# Altium footprint library GyokuRe.PcbLib: 1248 footprints (part 66 of 78)
Each footprint in its own frame and in the unit in brackets; x right, y up, seen from the top. Pads: shape width x height; smd on the part's side, far side on the other; paste and mask are expansions set on the pad; w line width, h text height; cw(c..) or ccw(c..) is an arc to the next point about the centre after c.
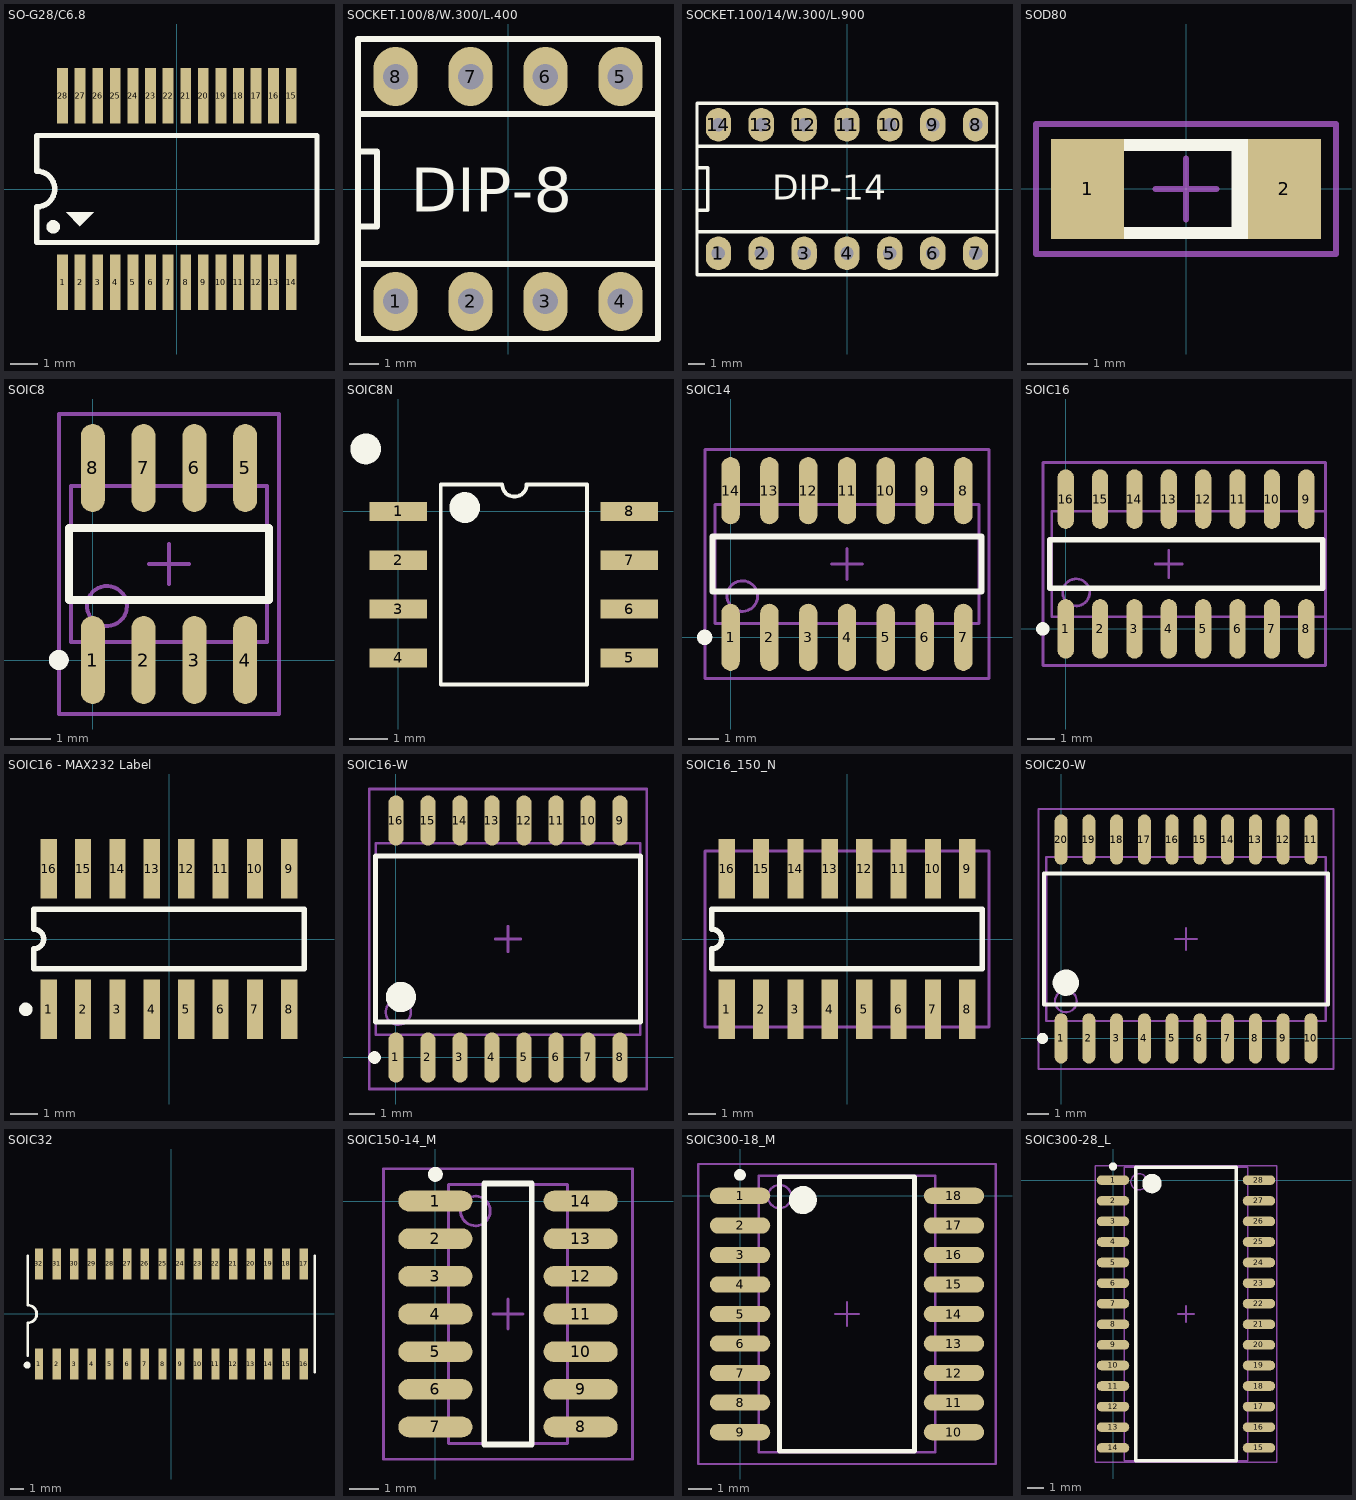
[diagram p65: the footprints below, top view; thin cyan lines are the x and y axes]

## SO-G28/C6.8 [mm] "SSOP, Plastic; 28 Leads; Body Width 5.3 mm; Pitch 0.65 mm"
height 1.99
pads (28):
  rect 0.4x2.05 smd: 1(-4.225,-3.451) 2(-3.575,-3.451) 3(-2.925,-3.451) 4(-2.275,-3.451) 5(-1.625,-3.451) 6(-0.975,-3.451) 7(-0.325,-3.451) 8(0.325,-3.451) 9(0.975,-3.451) 10(1.625,-3.451) 11(2.275,-3.451) 12(2.925,-3.451) 13(3.575,-3.451) 14(4.225,-3.451) 15(4.225,3.451) 16(3.575,3.451) 17(2.925,3.451) 18(2.275,3.451) 19(1.625,3.451) 20(0.975,3.451) 21(0.325,3.451) 22(-0.325,3.451) 23(-0.975,3.451) 24(-1.625,3.451) 25(-2.275,3.451) 26(-2.925,3.451) 27(-3.575,3.451) 28(-4.225,3.451)
Top Overlay:
  circle w0.25: c-4.57,-1.397 r0.125
  region: -4.089,-0.864 -3.581,-1.372 -3.073,-0.864
  lines w0.2: -5.175,-1.975 -5.175,-0.658 ccw(c-5.175,0) -5.175,0.658 -5.175,1.975 5.175,1.975 5.175,-1.975 -5.175,-1.975
3D body: height 0.25, standoff 0, extent -3.759,-3.429 -3.378,-2.032
3D body: height 0.25, standoff 0, extent -4.42,-3.429 -4.039,-2.032
3D body: height 1.02, standoff 0.23, extent -5.156,-1.981 5.258,2.083
3D body: height 0.25, standoff 0, extent -3.124,-3.454 -2.743,-2.057
3D body: height 0.25, standoff 0, extent -2.464,-3.454 -2.083,-2.057
3D body: height 0.25, standoff 0, extent -1.829,-3.454 -1.448,-2.057
3D body: height 0.25, standoff 0, extent -1.168,-3.454 -0.787,-2.057
3D body: height 0.25, standoff 0, extent -0.508,-3.454 -0.127,-2.057
3D body: height 0.25, standoff 0, extent 0.152,-3.454 0.533,-2.057
3D body: height 0.25, standoff 0, extent 0.762,-3.454 1.143,-2.057
3D body: height 0.25, standoff 0, extent 1.422,-3.454 1.803,-2.057
3D body: height 0.25, standoff 0, extent 2.083,-3.454 2.464,-2.057
3D body: height 0.25, standoff 0, extent 2.743,-3.454 3.124,-2.057
3D body: height 0.25, standoff 0, extent 3.378,-3.454 3.759,-2.057
3D body: height 0.25, standoff 0, extent 4.039,-3.454 4.42,-2.057
3D body: height 0.25, standoff 0, extent 4.039,2.007 4.42,3.404
3D body: height 0.25, standoff 0, extent 3.378,2.007 3.759,3.404
3D body: height 0.25, standoff 0, extent 2.743,2.007 3.124,3.404
3D body: height 0.25, standoff 0, extent 2.083,2.007 2.464,3.404
3D body: height 0.25, standoff 0, extent 1.422,2.007 1.803,3.404
3D body: height 0.25, standoff 0, extent 0.762,2.007 1.143,3.404
3D body: height 0.25, standoff 0, extent 0.152,2.007 0.533,3.404
3D body: height 0.25, standoff 0, extent -0.508,2.007 -0.127,3.404
3D body: height 0.25, standoff 0, extent -1.168,2.007 -0.787,3.404
3D body: height 0.25, standoff 0, extent -1.829,2.007 -1.448,3.404
3D body: height 0.25, standoff 0, extent -2.464,2.007 -2.083,3.404
3D body: height 0.25, standoff 0, extent -3.124,2.007 -2.743,3.404
3D body: height 0.25, standoff 0, extent -4.42,2.032 -4.039,3.429
3D body: height 0.25, standoff 0, extent -3.759,2.032 -3.378,3.429
3D body: height 1.27, standoff 1.02, extent -2.032,-0.305 -1.245,1.092
3D body: height 1.27, standoff 1.02, extent -3.175,-0.305 -2.362,1.092
3D body: height 1.27, standoff 1.02, extent -0.914,-0.305 -0.102,1.092
3D body: height 1.27, standoff 1.02, extent 0.254,-0.305 1.168,1.092
3D body: height 1.27, standoff 1.02, extent 1.524,-0.305 2.54,1.092
3D body: height 1.27, standoff 1.02, extent 2.794,-0.33 3.708,1.067
3D body: height 1.14, standoff 1.02, extent -4.804,-1.748 -4.296,-1.24

## SOCKET.100/8/W.300/L.400 [mm]
pads (8):
  oval 1.5x2 hole 0.864: 1(-3.81,-3.81) 2(-1.27,-3.81) 3(1.27,-3.81) 4(3.81,-3.81) 5(3.81,3.81) 6(1.27,3.81) 7(-1.27,3.81) 8(-3.81,3.81)
Top Overlay:
  lines w0.203: -5.08,-2.54 5.08,-2.54 ; -5.08,-2.54 -5.08,2.54 ; -5.08,-2.54 5.08,-2.54 ; -5.08,-2.54 -5.08,2.54 ; -5.08,-2.54 -5.08,-5.08 5.08,-5.08 5.08,2.54 ; -5.08,-2.54 -5.08,-1.27 ; -5.08,-1.27 -4.445,-1.27 ; -5.08,-1.27 -4.445,-1.27 ; -5.08,-1.27 -5.08,1.27 ; -5.08,1.27 -4.445,1.27 ; -5.08,1.27 -4.445,1.27 ; -5.08,1.27 -5.08,5.08 5.08,5.08 5.08,2.54 ; -5.08,2.54 5.08,2.54 ; -5.08,2.54 5.08,2.54 ; -4.445,-1.27 -4.445,1.27 ; -4.445,-1.27 -4.445,1.27 ; 5.08,-2.54 5.08,2.54 ; 5.08,-2.54 5.08,2.54
  text "DIP-8" at -3.302,-0.762 h1.5
3D body "Socket 8.step": height 4.5, standoff -3.09, extent -5.08,-5.08 5.08,5.08

## SOCKET.100/14/W.300/L.900 [mm]
height 5.59
pads (14):
  oval 1.5x2 hole 0.8: 1(-7.62,-3.81) 2(-5.08,-3.81) 3(-2.54,-3.81) 4(0,-3.81) 5(2.54,-3.81) 6(5.08,-3.81) 7(7.62,-3.81) 8(7.62,3.81) 9(5.08,3.81) 10(2.54,3.81) 11(0,3.81) 12(-2.54,3.81) 13(-5.08,3.81) 14(-7.62,3.81)
Top Overlay:
  lines w0.203: -8.89,-2.54 -8.89,-1.27 ; -8.89,-2.54 -8.89,-1.27 ; -8.89,-2.54 8.89,-2.54 ; -8.89,-2.54 8.89,-2.54 ; -8.89,-1.27 -8.255,-1.27 ; -8.89,-1.27 -8.89,1.27 ; -8.89,-1.27 -8.255,-1.27 ; -8.89,-1.27 -8.89,1.27 ; -8.89,1.27 -8.255,1.27 ; -8.89,1.27 -8.89,2.54 ; -8.89,1.27 -8.255,1.27 ; -8.89,1.27 -8.89,2.54 ; -8.89,2.54 8.89,2.54 ; -8.89,2.54 8.89,2.54 ; -8.255,-1.27 -8.255,1.27 ; -8.255,-1.27 -8.255,1.27 ; 8.89,-2.54 8.89,2.54 ; -8.89,-5.08 8.89,-5.08 8.89,5.08 -8.89,5.08 -8.89,-5.08
  text "DIP-14" at -4.445,-0.635 h1.5
3D body "Socket 14.step": height 4.5, standoff -3.09, extent -8.89,-5.08 8.89,5.08

## SOD80 [mm] "4148-SOD80 Diode, 2-Leads, Body 3.4x1.4mm, IPC Medium Density"
height 1.5
pads (2):
  rect 1.2x1.65 smd: 1(-1.625,0) 2(1.625,0)
Top Overlay:
  rectangle: 0.75,-0.725 1.3,0.75
  lines w0.2: 1.325,-0.725 -1.325,-0.725 -1.325,0.725 ; 1.325,-0.7 1.325,0.725 ; -1.325,0.725 1.325,0.725 ; -1.325,0.725 1.325,0.725
Mechanical 13:
  rectangle: -1.8,-0.75 -1.316,0.75
  lines w0.1: -1.8,-0.75 -1.8,0.75 1.8,0.75 1.8,-0.75 -1.8,-0.75
Mechanical 15:
  lines w0.1: -0.5,0 0.5,0 ; 0,-0.5 0,0.5 ; -2.475,-1.075 -2.475,1.075 2.475,1.075 2.475,-1.075 -2.475,-1.075
3D body: height 1.89, standoff 0.1, extent -2,-0.898 -1.6,0.898
3D body: height 1.89, standoff 0.1, extent 1.6,-0.898 2,0.898
3D body: height 1.61, standoff 0.4, extent 0.95,-0.644 1.55,0.574
3D body: height 1.6, standoff 0.4, extent -1.65,-0.625 1.35,0.573
3D body: height 1.89, standoff 0.1, extent -2,-0.9 2,0.896

## SOIC8 [mm] "SOIC, 8-Leads, Body 4.9x3.9mm, Pitch 1.27mm, IPC Medium Density"
height 1.75
pads (8):
  oval 0.6x2.2 smd: 1(0,0) 2(1.27,0) 3(2.54,0) 4(3.81,0) 5(3.81,4.8) 6(2.54,4.8) 7(1.27,4.8) 8(0,4.8)
Top Overlay:
  circle w0.25: c-0.85,0 r0.125
  lines w0.2: -0.595,1.5 -0.595,3.3 4.405,3.3 4.405,1.5 -0.595,1.5
Mechanical 13:
  circle w0.1: c0.355,1.35 r0.5
  lines w0.1: -0.545,0.45 -0.545,4.35 4.355,4.35 4.355,0.45 -0.545,0.45
Mechanical 15:
  lines w0.1: 1.405,2.4 2.405,2.4 ; 1.905,1.9 1.905,2.9 ; -0.845,-1.35 -0.845,6.15 4.655,6.15 4.655,-1.35 -0.845,-1.35
3D body: height 1.75, standoff 0, extent -0.545,0.45 4.355,4.35

## SOIC8N [mm]
pads (8):
  rect 1.5x0.5 smd: 1(0,0) 2(0,-1.27) 3(0,-2.54) 4(0,-3.81) 5(6,-3.81) 6(6,-2.54) 7(6,-1.27) 8(6,0)
Top Overlay:
  circle w0.4: c1.725,0.1 r0.2
  circle w0.4: c-0.85,1.625 r0.2
  lines w0.1: 1.1,-4.5 4.9,-4.5 4.9,0.7 3.335,0.7 cw(c3.017,0.7) 2.7,0.7 1.1,0.7 1.1,-4.5
3D body: height 0.25, standoff 0.01, extent -0.125,-1.51 0.975,-1.01
3D body: height 0.25, standoff 0.01, extent -0.1,-0.235 1,0.265
3D body: height 0.25, standoff 0.01, extent -0.125,-4.06 0.975,-3.56
3D body: height 0.25, standoff 0.01, extent -0.1,-2.785 1,-2.285
3D body: height 0.25, standoff 0.01, extent 5.025,-2.785 6.125,-2.285
3D body: height 0.25, standoff 0.01, extent 5.025,-4.05 6.125,-3.55
3D body: height 0.25, standoff 0.01, extent 5.025,-1.5 6.125,-1
3D body: height 0.25, standoff 0.01, extent 5.025,-0.225 6.125,0.275
3D body: height 1.75, standoff 0.25, extent 0.975,-4.55 5.025,0.75
3D body: height 1.76, standoff 1.74, extent 1.325,-0.3 2.125,0.475

## SOIC14 [mm] "SOIC, 14-Leads, Body 8.6x3.9mm, Pitch 1.27mm, IPC Medium Density"
height 1.75
pads (14):
  oval 0.6x2.2 smd: 1(0,0) 2(1.27,0) 3(2.54,0) 4(3.81,0) 5(5.08,0) 6(6.35,0) 7(7.62,0) 8(7.62,4.8) 9(6.35,4.8) 10(5.08,4.8) 11(3.81,4.8) 12(2.54,4.8) 13(1.27,4.8) 14(0,4.8)
Top Overlay:
  circle w0.25: c-0.85,0 r0.125
  lines w0.2: -0.59,1.5 -0.59,3.3 8.21,3.3 8.21,1.5 -0.59,1.5
Mechanical 13:
  circle w0.1: c0.385,1.35 r0.5
  lines w0.1: -0.515,0.45 -0.515,4.35 8.135,4.35 8.135,0.45 -0.515,0.45
Mechanical 15:
  lines w0.1: 3.31,2.4 4.31,2.4 ; 3.81,1.9 3.81,2.9 ; -0.84,-1.35 -0.84,6.15 8.46,6.15 8.46,-1.35 -0.84,-1.35
3D body: height 1.75, standoff 0, extent -0.515,0.45 8.135,4.35

## SOIC16 [mm] "SOIC, 16-Leads, Body 8.6x3.9mm, Pitch 1.27mm, IPC Medium Density"
height 1.75
pads (16):
  oval 0.6x2.2 smd: 1(0,0) 2(1.27,0) 3(2.54,0) 4(3.81,0) 5(5.08,0) 6(6.35,0) 7(7.62,0) 8(8.89,0) 9(8.89,4.8) 10(7.62,4.8) 11(6.35,4.8) 12(5.08,4.8) 13(3.81,4.8) 14(2.54,4.8) 15(1.27,4.8) 16(0,4.8)
Top Overlay:
  circle w0.25: c-0.85,0 r0.125
  lines w0.2: -0.59,1.5 9.5,1.5 9.5,3.3 -0.59,3.3 -0.59,1.5
Mechanical 13:
  circle w0.1: c0.385,1.35 r0.5
  lines w0.1: -0.515,0.45 9.6,0.45 9.6,4.35 -0.515,4.35 -0.515,0.45
Mechanical 15:
  lines w0.1: 3.31,2.4 4.31,2.4 ; 3.81,1.9 3.81,2.9 ; -0.84,-1.35 9.6,-1.35 9.6,6.15 -0.84,6.15 -0.84,-1.35
3D body: height 1.75, standoff 0, extent -0.515,0.45 9.6,4.35

## SOIC16 - MAX232 Label [mm] "Small Outline; 16 Leads; Body Width 3.5 mm; Pitch 1.27 mm"
pads (16):
  rect 0.6x2.2 smd: 1(-4.445,-2.6) 2(-3.175,-2.6) 3(-1.905,-2.6) 4(-0.635,-2.6) 5(0.635,-2.6) 6(1.905,-2.6) 7(3.175,-2.6) 8(4.445,-2.6) 9(4.445,2.6) 10(3.175,2.6) 11(1.905,2.6) 12(0.635,2.6) 13(-0.635,2.6) 14(-1.905,2.6) 15(-3.175,2.6) 16(-4.445,2.6)
Top Overlay:
  circle w0.25: c-5.295,-2.6 r0.125
  lines w0.2: -5,-1.1 5,-1.1 5,1.1 -5,1.1 -5,0.367 cw(c-5,0) -5,-0.367 -5,-1.1
3D body: height 0.25, standoff 0.01, extent -3.425,-3.125 -2.925,-2.025
3D body: height 0.25, standoff 0.01, extent -4.7,-3.1 -4.2,-2
3D body: height 0.25, standoff 0.01, extent -0.875,-3.125 -0.375,-2.025
3D body: height 0.25, standoff 0.01, extent -2.15,-3.1 -1.65,-2
3D body: height 0.25, standoff 0.01, extent 1.65,-3.1 2.15,-2
3D body: height 0.25, standoff 0.01, extent 0.375,-3.075 0.875,-1.975
3D body: height 0.25, standoff 0.01, extent 4.2,-3.125 4.7,-2.025
3D body: height 0.25, standoff 0.01, extent 2.925,-3.1 3.425,-2
3D body: height 0.25, standoff 0.01, extent 2.925,2.025 3.425,3.125
3D body: height 0.25, standoff 0.01, extent 4.2,2 4.7,3.1
3D body: height 0.25, standoff 0.01, extent 0.375,2.025 0.875,3.125
3D body: height 0.25, standoff 0.01, extent 1.65,2 2.15,3.1
3D body: height 0.25, standoff 0.01, extent -2.15,2.025 -1.65,3.125
3D body: height 0.25, standoff 0.01, extent -0.875,2 -0.375,3.1
3D body: height 0.25, standoff 0.01, extent -3.425,2 -2.925,3.1
3D body: height 0.25, standoff 0.01, extent -4.7,2.025 -4.2,3.125
3D body: height 1.75, standoff 0.25, extent -4.996,-2 5.004,2
3D body: height 1.76, standoff 1.74, extent 1.425,-0.55 2.425,0.825
3D body: height 1.76, standoff 1.74, extent 2.625,-0.55 3.625,0.825
3D body: height 1.76, standoff 1.74, extent 0.225,-0.55 1.225,0.825
3D body: height 1.76, standoff 1.74, extent -0.975,-0.525 0.025,0.8
3D body: height 1.76, standoff 1.74, extent -2,0.05 -1.35,0.25
3D body: height 1.76, standoff 1.74, extent -2.175,-0.525 -1.175,0.8
3D body: height 1.76, standoff 1.74, extent -3.375,-0.525 -2.375,0.8
3D body: height 1.76, standoff 1.74, extent -4.5,-1.575 -3.7,-0.8

## SOIC16-W [mm] "SOIC, 16-Leads, Body 10.3x7.5mm, Pitch 1.27mm, IPC Medium Density"
height 2.67
pads (16):
  oval 0.6x2 smd: 1(0,0) 2(1.27,0) 3(2.54,0) 4(3.81,0) 5(5.08,0) 6(6.35,0) 7(7.62,0) 8(8.89,0) 9(8.89,9.4) 10(7.62,9.4) 11(6.35,9.4) 12(5.08,9.4) 13(3.81,9.4) 14(2.54,9.4) 15(1.27,9.4) 16(0,9.4)
Top Overlay:
  circle w0.6: c0.195,2.4 r0.3
  circle w0.25: c-0.85,0 r0.125
  lines w0.2: -0.805,1.4 -0.805,8 9.695,8 9.695,1.4 -0.805,1.4
Mechanical 13:
  circle w0.1: c0.095,1.8 r0.5
  lines w0.1: -0.805,0.9 -0.805,8.5 9.695,8.5 9.695,0.9 -0.805,0.9
Mechanical 15:
  lines w0.1: 3.945,4.7 4.945,4.7 ; 4.445,4.2 4.445,5.2 ; -1.055,-1.25 -1.055,10.65 9.945,10.65 9.945,-1.25 -1.055,-1.25
3D body: height 2.67, standoff 0, extent -0.805,0.9 9.695,8.5

## SOIC16_150_N [mm] "Small Outline; 16 Leads; Body Width 3.5 mm; Pitch 1.27 mm"
pads (16):
  rect 0.6x2.2 smd: 1(-4.445,-2.6) 2(-3.175,-2.6) 3(-1.905,-2.6) 4(-0.635,-2.6) 5(0.635,-2.6) 6(1.905,-2.6) 7(3.175,-2.6) 8(4.445,-2.6) 9(4.445,2.6) 10(3.175,2.6) 11(1.905,2.6) 12(0.635,2.6) 13(-0.635,2.6) 14(-1.905,2.6) 15(-3.175,2.6) 16(-4.445,2.6)
Top Overlay:
  lines w0.2: -5,-1.1 5,-1.1 5,1.1 -5,1.1 -5,0.367 cw(c-5,0) -5,-0.367 -5,-1.1
Mechanical 15:
  lines w0.1: -5.25,-3.25 -5.25,3.25 5.25,3.25 5.25,-3.25 -5.25,-3.25
3D body "SOIC16-150.STEP": height 1.75, standoff 0, extent -4.9,-2.875 4.9,2.925

## SOIC20-W [mm] "SOIC, 20-Leads, Body 12.8x7.5mm, Pitch 1.27mm, IPC Medium Density"
height 2.65
pads (20):
  oval 0.6x2.3 smd: 1(0,0) 2(1.27,0) 3(2.54,0) 4(3.81,0) 5(5.08,0) 6(6.35,0) 7(7.62,0) 8(8.89,0) 9(10.16,0) 10(11.43,0) 11(11.43,9.1) 12(10.16,9.1) 13(8.89,9.1) 14(7.62,9.1) 15(6.35,9.1) 16(5.08,9.1) 17(3.81,9.1) 18(2.54,9.1) 19(1.27,9.1) 20(0,9.1)
Top Overlay:
  circle w0.6: c0.215,2.55 r0.3
  circle w0.25: c-0.85,0 r0.125
  lines w0.2: -0.785,1.55 -0.785,7.55 12.215,7.55 12.215,1.55 -0.785,1.55
Mechanical 13:
  circle w0.1: c0.215,1.7 r0.5
  lines w0.1: -0.685,0.8 -0.685,8.3 12.115,8.3 12.115,0.8 -0.685,0.8
Mechanical 15:
  lines w0.1: 5.215,4.55 6.215,4.55 ; 5.715,4.05 5.715,5.05 ; -1.035,-1.4 -1.035,10.5 12.465,10.5 12.465,-1.4 -1.035,-1.4
3D body: height 2.65, standoff 0, extent -0.685,0.8 12.115,8.3

## SOIC32 [mm] "Small Outline; 32 Leads; Body Width 5.2 mm; Pitch 1.27 mm"
pads (32):
  rect 0.6x2.2 smd: 1(-9.525,-3.6) 2(-8.255,-3.6) 3(-6.985,-3.6) 4(-5.715,-3.6) 5(-4.445,-3.6) 6(-3.175,-3.6) 7(-1.905,-3.6) 8(-0.635,-3.6) 9(0.635,-3.6) 10(1.905,-3.6) 11(3.175,-3.6) 12(4.445,-3.6) 13(5.715,-3.6) 14(6.985,-3.6) 15(8.255,-3.6) 16(9.525,-3.6) 17(9.525,3.6) 18(8.255,3.6) 19(6.985,3.6) 20(5.715,3.6) 21(4.445,3.6) 22(3.175,3.6) 23(1.905,3.6) 24(0.635,3.6) 25(-0.635,3.6) 26(-1.905,3.6) 27(-3.175,3.6) 28(-4.445,3.6) 29(-5.715,3.6) 30(-6.985,3.6) 31(-8.255,3.6) 32(-9.525,3.6)
Top Overlay:
  circle w0.25: c-10.375,-3.676 r0.125
  lines w0.2: -10.325,-2.996 -10.325,-0.635 ccw(c-10.325,0) -10.325,0.635 -10.325,4.191 ; 10.325,-4.191 10.325,4.191

## SOIC150-14_M [mm] "SOIC, 14-Leads, Body 8.7x3.9mm, Pitch 1.27mm, IPC Low Density"
height 1.76
pads (14):
  oval 2.5x0.7 smd: 1(0,0) 2(0,-1.27) 3(0,-2.54) 4(0,-3.81) 5(0,-5.08) 6(0,-6.35) 7(0,-7.62) 8(4.9,-7.62) 9(4.9,-6.35) 10(4.9,-5.08) 11(4.9,-3.81) 12(4.9,-2.54) 13(4.9,-1.27) 14(4.9,0)
Top Overlay:
  circle w0.25: c0,0.9 r0.125
  lines w0.2: 1.65,-8.21 3.25,-8.21 3.25,0.59 1.65,0.59 1.65,-8.21
Mechanical 13:
  circle w0.1: c1.35,-0.335 r0.5
  lines w0.1: 0.45,-8.185 4.45,-8.185 4.45,0.565 0.45,0.565 0.45,-8.185
Mechanical 15:
  lines w0.1: 1.95,-3.81 2.95,-3.81 ; 2.45,-4.31 2.45,-3.31 ; -1.75,-8.71 6.65,-8.71 6.65,1.09 -1.75,1.09 -1.75,-8.71
3D body: height 0.25, standoff 0.01, extent -0.575,-4.05 0.525,-3.55
3D body: height 0.25, standoff 0.01, extent -0.575,-1.5 0.525,-1
3D body: height 0.25, standoff 0.01, extent -0.575,-2.775 0.525,-2.275
3D body: height 0.25, standoff 0.01, extent -0.575,-0.25 0.525,0.25
3D body: height 0.25, standoff 0.01, extent -0.525,-6.6 0.575,-6.1
3D body: height 0.25, standoff 0.01, extent -0.525,-7.875 0.575,-7.375
3D body: height 0.25, standoff 0.01, extent -0.525,-5.35 0.575,-4.85
3D body: height 0.25, standoff 0.01, extent 4.3,-0.225 5.4,0.275
3D body: height 0.25, standoff 0.01, extent 4.3,-2.775 5.4,-2.275
3D body: height 0.25, standoff 0.01, extent 4.3,-1.5 5.4,-1
3D body: height 0.25, standoff 0.01, extent 4.3,-4.025 5.4,-3.525
3D body: height 0.25, standoff 0.01, extent 4.35,-6.6 5.45,-6.1
3D body: height 0.25, standoff 0.01, extent 4.35,-5.325 5.45,-4.825
3D body: height 0.25, standoff 0.01, extent 4.35,-7.85 5.45,-7.35
3D body: height 1.76, standoff 1.74, extent 0.775,-0.575 1.575,0.2
3D body: height 1.75, standoff 0, extent 0.45,-8.185 4.45,0.565

## SOIC300-18_M [mm] "SOIC, 18-Leads, Body 11.5x7.5mm, Pitch 1.27mm, IPC Low Density"
height 2.65
pads (18):
  oval 2.6x0.7 smd: 1(0,0) 2(0,-1.27) 3(0,-2.54) 4(0,-3.81) 5(0,-5.08) 6(0,-6.35) 7(0,-7.62) 8(0,-8.89) 9(0,-10.16) 10(9.2,-10.16) 11(9.2,-8.89) 12(9.2,-7.62) 13(9.2,-6.35) 14(9.2,-5.08) 15(9.2,-3.81) 16(9.2,-2.54) 17(9.2,-1.27) 18(9.2,0)
Top Overlay:
  circle w0.25: c0,0.9 r0.125
  circle w0.6: c2.7,-0.18 r0.3
  lines w0.2: 1.7,-10.98 1.7,0.82 7.5,0.82 7.5,-10.98 1.7,-10.98
Mechanical 13:
  circle w0.1: c1.7,-0.03 r0.5
  lines w0.1: 0.8,-11.03 0.8,0.87 8.4,0.87 8.4,-11.03 0.8,-11.03
Mechanical 15:
  lines w0.1: 4.1,-5.08 5.1,-5.08 ; 4.6,-5.58 4.6,-4.58 ; -1.8,-11.53 -1.8,1.37 11,1.37 11,-11.53 -1.8,-11.53
3D body: height 2.65, standoff 0, extent 0.8,-11.03 8.4,0.87

## SOIC300-28_L [mm] "SOIC, 28-Leads, Body 17.9x7.5mm, Pitch 1.27mm, IPC High Density"
height 2.65
pads (28):
  oval 2x0.6 smd: 1(0,0) 2(0,-1.27) 3(0,-2.54) 4(0,-3.81) 5(0,-5.08) 6(0,-6.35) 7(0,-7.62) 8(0,-8.89) 9(0,-10.16) 10(0,-11.43) 11(0,-12.7) 12(0,-13.97) 13(0,-15.24) 14(0,-16.51) 15(9,-16.51) 16(9,-15.24) 17(9,-13.97) 18(9,-12.7) 19(9,-11.43) 20(9,-10.16) 21(9,-8.89) 22(9,-7.62) 23(9,-6.35) 24(9,-5.08) 25(9,-3.81) 26(9,-2.54) 27(9,-1.27) 28(9,0)
Top Overlay:
  circle w0.6: c2.4,-0.205 r0.3
  circle w0.25: c0,0.85 r0.125
  lines w0.2: 1.4,-17.305 7.6,-17.305 7.6,0.795 1.4,0.795 1.4,-17.305
Mechanical 13:
  circle w0.1: c1.6,-0.1 r0.5
  lines w0.1: 0.7,-17.31 8.3,-17.31 8.3,0.8 0.7,0.8 0.7,-17.31
Mechanical 15:
  lines w0.1: 4,-8.255 5,-8.255 ; 4.5,-8.755 4.5,-7.755 ; -1.1,-17.405 10.1,-17.405 10.1,0.895 -1.1,0.895 -1.1,-17.405
3D body: height 2.65, standoff 0, extent 0.7,-17.31 8.3,0.8